# Altium integrated library PlantiumIntegratedLibrary.IntLib: 638 symbols (part 4 of 6)
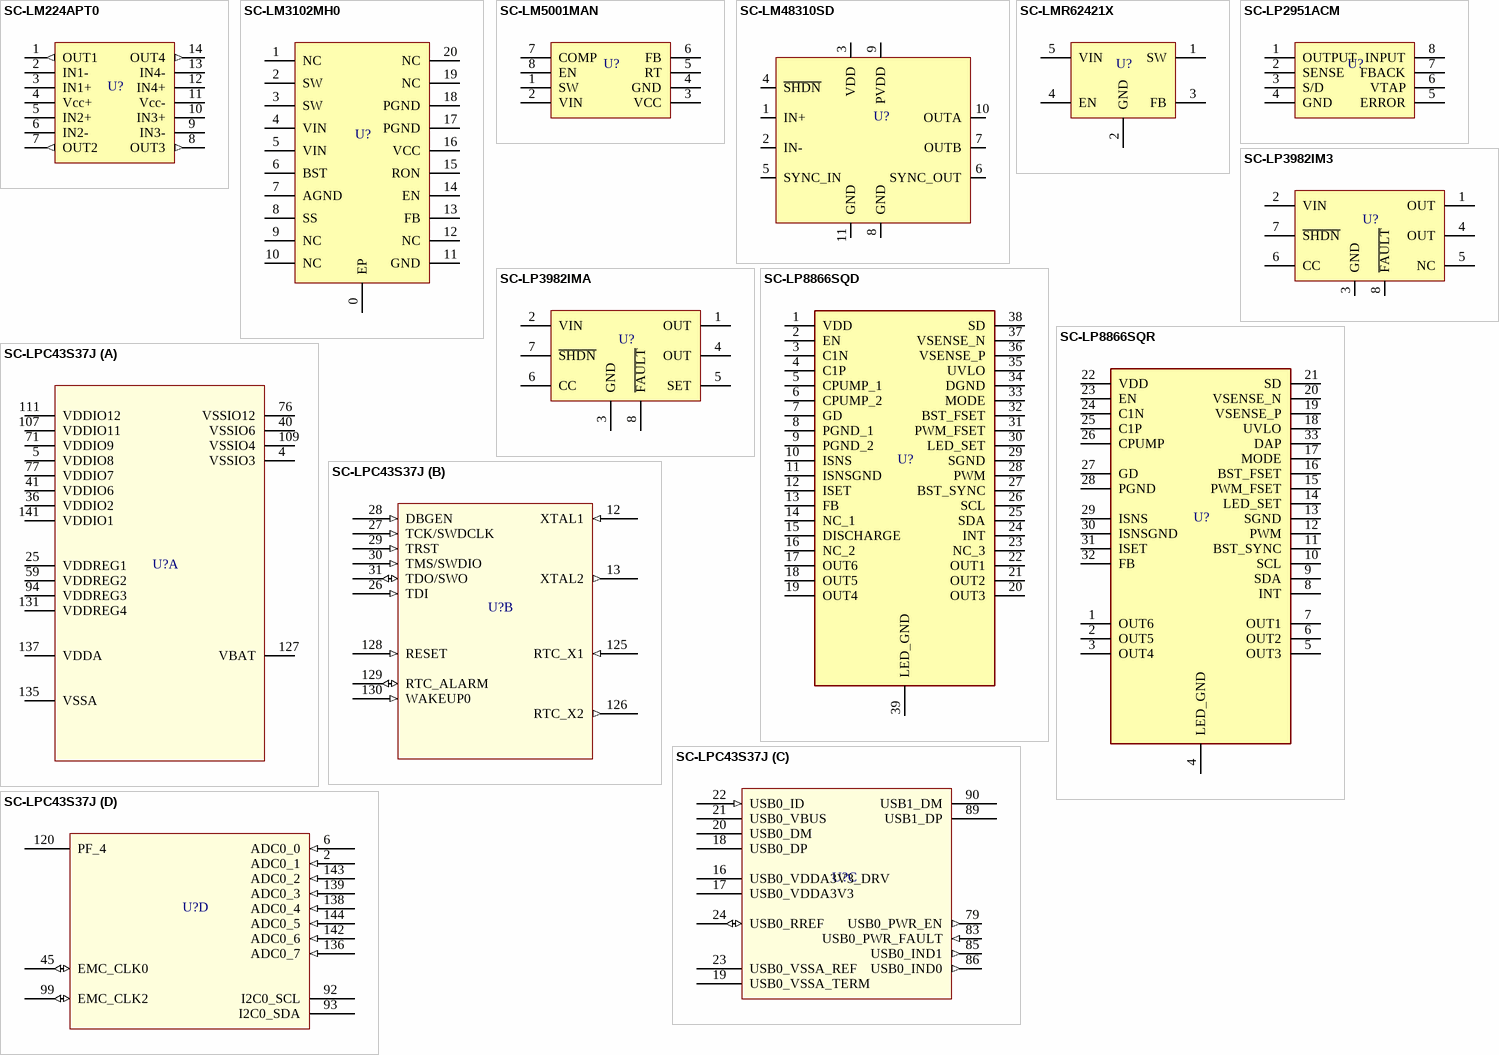
[diagram p37: symbols SC-LM224APT0 to SC-LPC43S37J]

## SC-LM224APT0
designator U?
General Purpose Amplifier 4 Circuit - 14-TSSOP; Manufacturer Part Number: LM224APT; Manufacturer: STMicroelectronics; Working Temperature: -40°C ~ 105°C; Temperature Coefficient: NC; Short Description: IC OPAMP GP 4 CIRCUIT 14TSSOP; Ratings: REACH, ROHS3; Voltage: 3V ~ 30V, ±1.5V ~ 15V; Value: NC; Mounting: SMT; Power: NC; Type: NC; Frequency: NC; Alternate Part Number 1: *; Alternate Part Number 2: *; Tolerance: NC; Current: NC; Revision Date: 03/08/21; Package Reference: TSSOP-14
footprint TSSOP-14 (Footprint not found)
pins: 1 OUT1 (out), 2 IN1- (hiz), 3 IN1+ (hiz), 4 Vcc+ (power), 5 IN2+ (hiz), 6 IN2- (hiz), 7 OUT2 (out), 8 OUT3 (out), 9 IN3- (hiz), 10 IN3+ (hiz), 11 Vcc- (power), 12 IN4+ (hiz), 13 IN4- (hiz), 14 OUT4 (out)

## SC-LM3102MH0
designator U?
Buck Switching Regulator IC Positive Adjustable 0.8V 1 Output 2.5A 20-PowerTSSOP (0.173", 4.40mm Width); Manufacturer Part Number: LM3102MH/NOPB; Manufacturer: Texas Instruments; Working Temperature: -40°C ~ 125°C (TJ); Temperature Coefficient: NC; Short Description: IC REG BUCK ADJ 2.5A 20HTSSOP; Ratings: REACH, ROHS3; Frequency: 1MHz; Voltage: 42V; Value: NC; Mounting: SMT; Power: NC; Type: Buck; Alternate Part Number 1: *; Alternate Part Number 2: *; Tolerance: NC; Current: 2.5A; Revision Date: 03/08/21; Package Reference: HTSSOP-20
footprint HTSSOP-20 (Footprint not found)
pins: 0 EP, 1 NC, 2 SW, 3 SW, 4 VIN, 5 VIN, 6 BST, 7 AGND, 8 SS, 9 NC, 10 NC, 11 GND, 12 NC, 13 FB, 14 EN, 15 RON, 16 VCC, 17 PGND, 18 PGND, 19 NC, 20 NC

## SC-LM5001MAN
designator U?
Boost, Flyback, Forward Converter, SEPIC Switching Regulator IC Positive, Isolation Capable Adjustable 3.1V 1 Output 800mA (Switch) 8-SOIC (0.154", 3.90mm Width); Manufacturer Part Number: LM5001MA/NOPB; Manufacturer: Texas Instruments; Working Temperature: -40°C ~ 125°C (TJ); Temperature Coefficient: NC; Short Description: IC REG MULTI CONFG ADJ 8SOIC; Ratings: REACH, ROHS3; Frequency: 50kHz ~ 1.5MHz; Value: NC; Mounting: SMT; Power: NC; Type: Step-Up; Alternate Part Number 1: *; Alternate Part Number 2: *; Tolerance: NC; Current: 800mA; Revision Date: 03/08/21; Package Reference: SOIC-8N; Voltage: NC
footprint SOIC-8N (Footprint not found)
pins: 1 SW, 2 VIN, 3 VCC, 4 GND, 5 RT, 6 FB, 7 COMP, 8 EN

## SC-LM48310SD
designator U?
Amplifier IC 1-Channel (Mono) Class D 10-WSON (3x3); Manufacturer Part Number: LM48310SD/NOPB; Manufacturer: Texas Instruments; Working Temperature: -40°C ~ 85°C (TA); Temperature Coefficient: NC; Short Description: IC AMP CLASS D MONO 2.6W 10WSON; Power: 2.6W; Ratings: REACH, ROHS3; Voltage: 2.4V ~ 5.5V; Value: NC; Mounting: SMT; Type: Class D; Frequency: NC; Alternate Part Number 1: *; Alternate Part Number 2: *; Tolerance: NC; Current: NC; Revision Date: 03/08/21; Package Reference: WFDFN-10
footprint WFDFN-10
pins: 1 IN+, 2 IN-, 3 VDD, 4 ~{SHDN}, 5 SYNC_IN, 6 SYNC_OUT, 7 OUTB, 8 GND, 9 PVDD, 10 OUTA, 11 GND

## SC-LMR62421X
designator U?
Boost, SEPIC Switching Regulator IC Positive Adjustable 2.7V 1 Output 2.1A (Switch) SC-74A, SOT-753; Manufacturer Part Number: LMR62421XMFE/NOPB; Manufacturer: Texas Instruments; Working Temperature: -40°C ~ 125°C (TJ); Temperature Coefficient: NC; Short Description: IC REG BST SEPIC ADJ 2.1A SOT23; Ratings: REACH, ROHS3; Frequency: 1.6MHz; Value: NC; Mounting: SMT; Power: NC; Type: Step-Up; Alternate Part Number 1: *; Alternate Part Number 2: *; Tolerance: NC; Current: 2.1A; Revision Date: 03/08/21; Package Reference: SOT-23-5; Voltage: NC
footprint SOT-23-5 (Footprint not found)
pins: 1 SW, 2 GND, 3 FB, 4 EN, 5 VIN

## SC-LP2951ACM
designator U?
Linear Voltage Regulator IC Positive Adjustable (Fixed) Output 100mA 8-SOIC; Manufacturer Part Number: LP2951ACM/NOPB; Manufacturer: Texas Instruments; Working Temperature: -40°C ~ 125°C (TJ); Temperature Coefficient: NC; Short Description: IC REG LIN POS ADJ 100MA 8SOIC; Ratings: REACH, ROHS3; Voltage: 30V; Value: NC; Mounting: SMT; Power: NC; Type: Linear; Frequency: NC; Alternate Part Number 1: *; Alternate Part Number 2: *; Tolerance: NC; Current: 100mA; Revision Date: 03/08/21; Package Reference: SOIC-8N
footprint SOIC-8N (Footprint not found)
pins: 1 OUTPUT, 2 SENSE, 3 S/D, 4 GND, 5 ERROR, 6 VTAP, 7 FBACK, 8 INPUT

## SC-LP3982IM3
designator U?
Linear Voltage Regulator IC Positive Fixed 1 Output 300mA 8-VSSOP; Manufacturer Part Number: LP3982IMM-3.3/NOPB; Manufacturer: Texas Instruments; Working Temperature: -40°C ~ 85°C; Temperature Coefficient: NC; Short Description: IC REG LINEAR 3.3V 300MA 8VSSOP; Ratings: REACH, ROHS3; Voltage: 6V; Value: NC; Mounting: SMT; Power: NC; Type: Linear; Frequency: NC; Alternate Part Number 1: *; Alternate Part Number 2: *; Tolerance: NC; Current: 300mA; Revision Date: 03/08/21; Package Reference: VSSOP-8; ComponentLink1Description: Datasheet; ComponentLink1URL: https://www.ti.com/lit/gpn/lp3982
footprint VSSOP-8 (Footprint not found)
pins: 1 OUT, 2 VIN, 3 GND, 4 OUT, 5 NC, 6 CC, 7 ~{SHDN}, 8 ~{FAULT}

## SC-LP3982IMA
designator U?
Linear Voltage Regulator IC Positive Adjustable 1 Output 300mA 8-VSSOP; Manufacturer Part Number: LP3982IMM-ADJ/NOPB; Alternate Part Number 1: LP3982IMMX-ADJ/NOPB; Manufacturer: Texas Instruments; Working Temperature: -40°C ~ 85°C; Temperature Coefficient: NC; Short Description: IC REG LIN POS ADJ 300MA 8VSSOP; Ratings: REACH, ROHS3; Voltage: 6V; Value: NC; Mounting: SMT; Power: NC; Type: Linear; Frequency: NC; Alternate Part Number 2: *; Tolerance: NC; Current: 300mA; Revision Date: 03/08/21; Package Reference: VSSOP-8; ComponentLink1Description: Datasheet; ComponentLink1URL: https://www.ti.com/lit/gpn/lp3982
footprint VSSOP-8 (Footprint not found)
pins: 1 OUT, 2 VIN, 3 GND, 4 OUT, 5 SET, 6 CC, 7 ~{SHDN}, 8 ~{FAULT}

## SC-LP8866SQD
designator U?
LED Driver IC 6 Output DC DC Controller SEPIC, Step-Up (Boost) PWM Dimming 150mA 38-HTSSOP; Manufacturer Part Number: LP8866SQDCPRQ1; Manufacturer: Texas Instruments; Working Temperature: -40°C ~ 125°C; Temperature Coefficient: NC; Short Description: AUTOMOTIVE DISPLAY LED-BACKLIGHT; Ratings: REACH, ROHS3; Value: NC; Mounting: SMT; Power: NC; Type: NC; Frequency: NC; Alternate Part Number 1: *; Alternate Part Number 2: *; Tolerance: NC; Current: NC; Revision Date: 20/09/21; Package Reference: 38-TFSOP; Voltage: NC; ComponentLink1Description: Datasheet; ComponentLink1URL: https://www.ti.com/lit/gpn/lp8866-q1
footprint TFSOP-38
pins: 1 VDD, 2 EN, 3 C1N, 4 C1P, 5 CPUMP_1, 6 CPUMP_2, 7 GD, 8 PGND_1, 9 PGND_2, 10 ISNS, 11 ISNSGND, 12 ISET, 13 FB, 14 NC_1, 15 DISCHARGE, 16 NC_2, 17 OUT6, 18 OUT5, 19 OUT4, 20 OUT3, 21 OUT2, 22 OUT1, 23 NC_3, 24 INT, 25 SDA, 26 SCL, 27 BST_SYNC, 28 PWM, 29 SGND, 30 LED_SET, 31 PWM_FSET, 32 BST_FSET, 33 MODE, 34 DGND, 35 UVLO, 36 VSENSE_P, 37 VSENSE_N, 38 SD, 39 LED_GND

## SC-LP8866SQR
designator U?
LED Driver IC 6 Output DC DC Controller SEPIC, Step-Up (Boost) Analog, I²C, PWM Dimming 150mA 32-VQFN (5x5); Manufacturer Part Number: LP8866SQRHBRQ1; Manufacturer: Texas Instruments; Working Temperature: -40°C ~ 125°C; Temperature Coefficient: NC; Short Description: AUTOMOTIVE DISPLAY LED-BACKLIGHT; Value: NC; Mounting: SMT; Power: NC; Type: NC; Frequency: NC; Alternate Part Number 1: *; Alternate Part Number 2: *; Tolerance: NC; Current: NC; Revision Date: 28/01/2022; Package Reference: VQFN-32_5x5; Voltage: NC; ComponentLink1Description: Datasheet; ComponentLink1URL: https://www.ti.com/lit/gpn/lp8866-q1
footprint VQFN-32_5x5 (32-VFQFN Exposed Pad)
pins: 1 OUT6, 2 OUT5, 3 OUT4, 4 LED_GND, 5 OUT3, 6 OUT2, 7 OUT1, 8 INT, 9 SDA, 10 SCL, 11 BST_SYNC, 12 PWM, 13 SGND, 14 LED_SET, 15 PWM_FSET, 16 BST_FSET, 17 MODE, 18 UVLO, 19 VSENSE_P, 20 VSENSE_N, 21 SD, 22 VDD, 23 EN, 24 C1N, 25 C1P, 26 CPUMP, 27 GD, 28 PGND, 29 ISNS, 30 ISNSGND, 31 ISET, 32 FB, 33 DAP

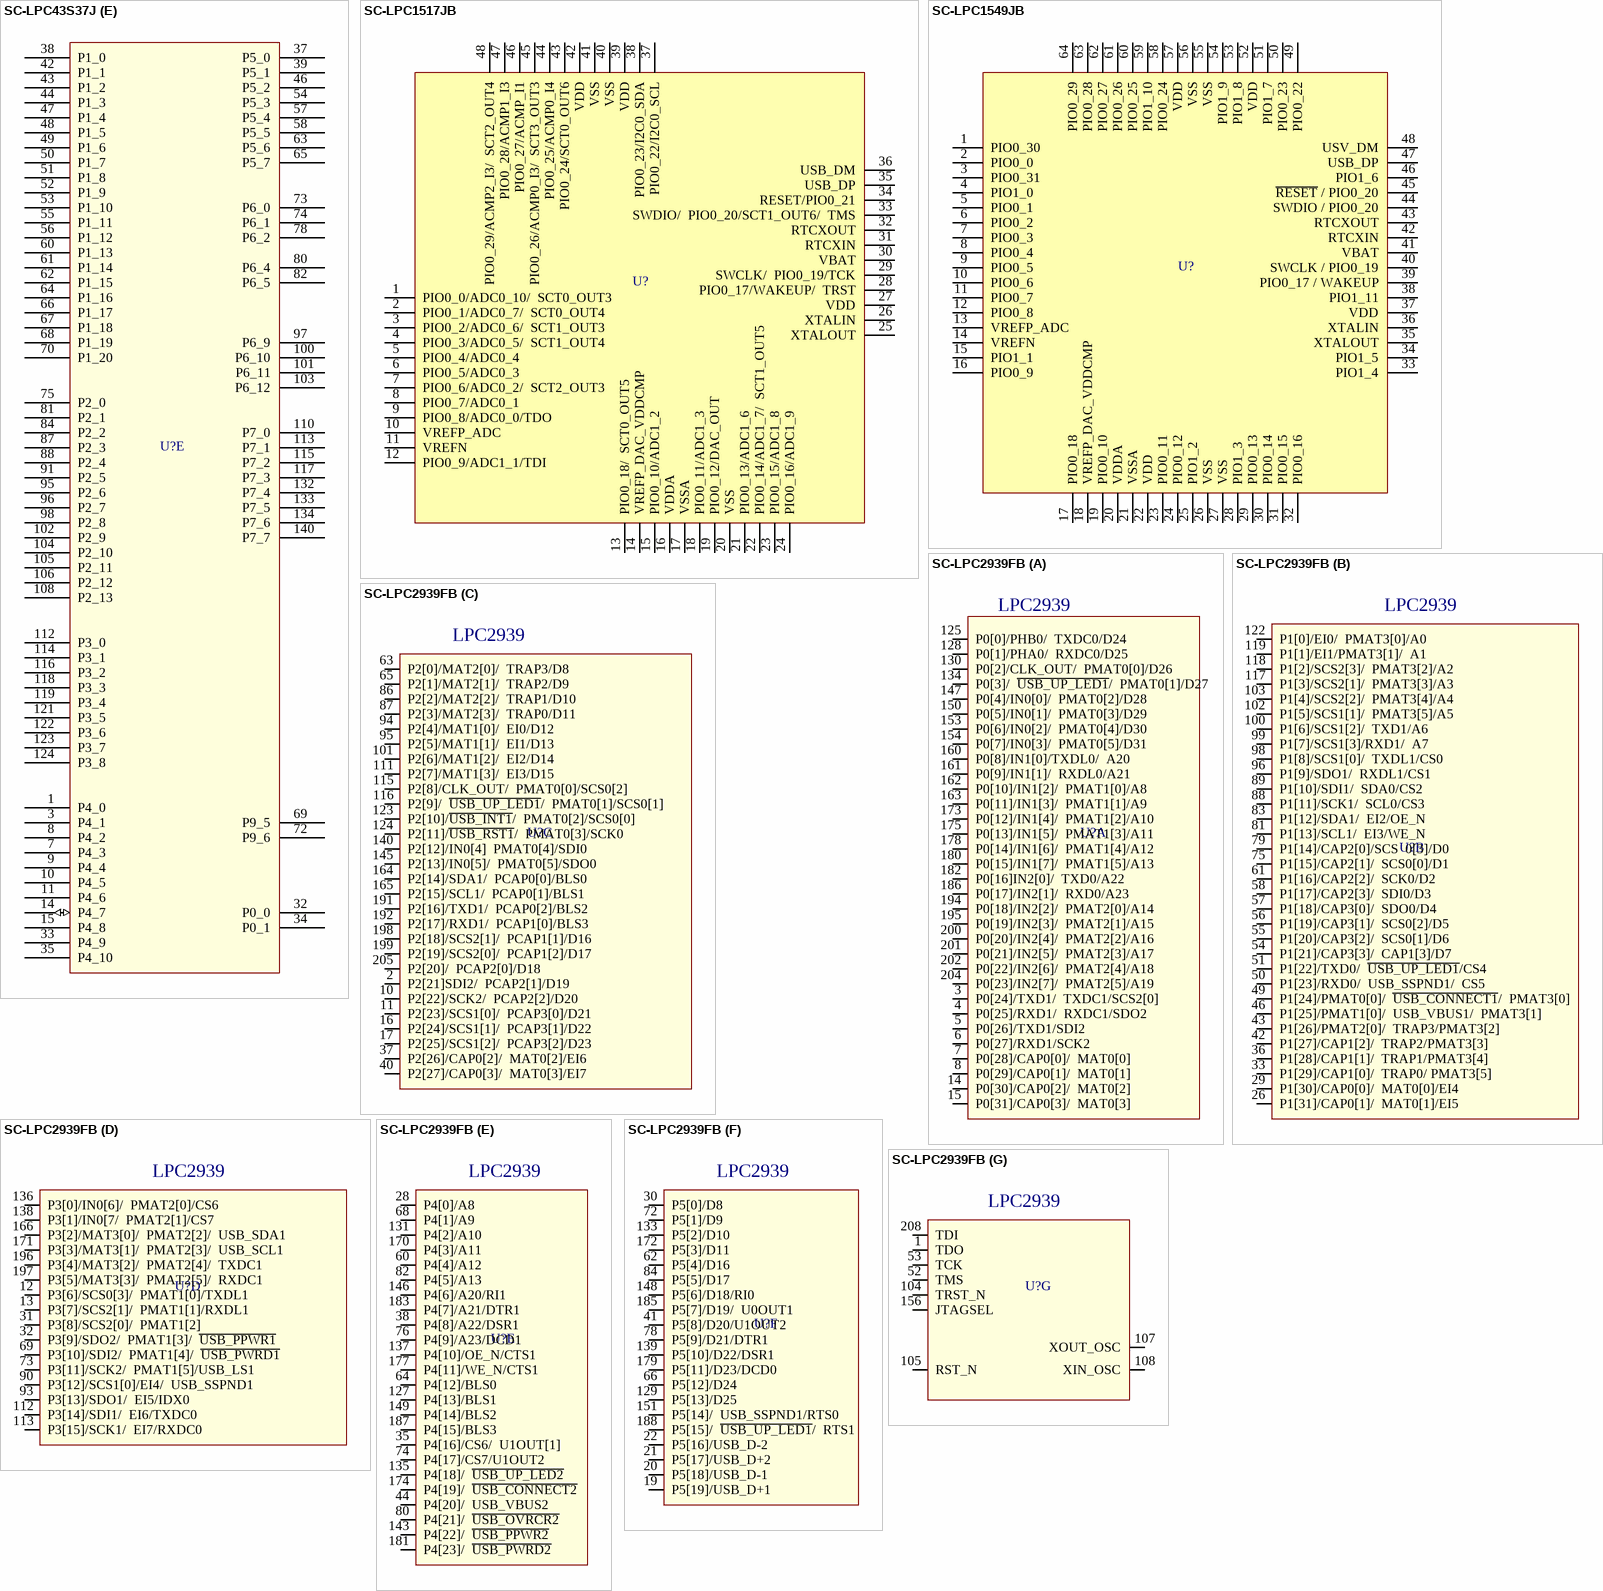
[diagram p18: symbols SC-LPC43S37J to SC-LPC2939FB]

## SC-LPC43S37J
designator U?
ARM® Cortex®-M4/M0 series Microcontroller IC 32-Bit Dual-Core 204MHz 1MB (1M x 8) FLASH 144-LQFP (20x20); Manufacturer Part Number: LPC43S37JBD144E; Manufacturer: NXP USA Inc.; Working Temperature: -40°C ~ 105°C (TA); Temperature Coefficient: NC; Short Description: IC MCU 32BIT 1MB FLASH 144LQFP; Ratings: REACH, ROHS3; Voltage: 2.2V ~ 3.6V; Value: NC; Mounting: SMT; Power: NC; Type: ARM® Cortex®-M4/M0; Frequency: 204MHz; Alternate Part Number 1: *; Alternate Part Number 2: *; Tolerance: NC; Current: NC; Revision Date: 03/08/21; Package Reference: LQFP-144
footprint LQFP-144 (Footprint not found)
part A pins: 4 VSSIO3 (power), 5 VDDIO8 (power), 25 VDDREG1 (power), 36 VDDIO2 (power), 40 VSSIO6 (power), 41 VDDIO6 (power), 59 VDDREG2 (power), 71 VDDIO9 (power), 76 VSSIO12 (power), 77 VDDIO7 (power), 94 VDDREG3 (power), 107 VDDIO11 (power), 109 VSSIO4 (power), 111 VDDIO12 (power), 127 VBAT (power), 131 VDDREG4 (power), 135 VSSA (power), 137 VDDA (power), 141 VDDIO1 (power)
part B pins: 12 XTAL1 (in), 13 XTAL2 (out), 26 TDI (in), 27 TCK/SWDCLK (in), 28 DBGEN (in), 29 TRST (in), 30 TMS/SWDIO (in), 31 TDO/SWO (io), 125 RTC_X1 (in), 126 RTC_X2 (out), 128 RESET (in), 129 RTC_ALARM (io), 130 WAKEUP0 (in)
part C pins: 16 USB0_VDDA3V3_DRV (power), 17 USB0_VDDA3V3 (power), 18 USB0_DP (hiz), 19 USB0_VSSA_TERM (power), 20 USB0_DM (hiz), 21 USB0_VBUS (hiz), 22 USB0_ID (in), 23 USB0_VSSA_REF (power), 24 USB0_RREF (io), 79 USB0_PWR_EN (out), 83 USB0_PWR_FAULT (in), 85 USB0_IND1 (out), 86 USB0_IND0 (out), 89 USB1_DP (hiz), 90 USB1_DM (hiz)
part D pins: 2 ADC0_1 (in), 6 ADC0_0 (in), 45 EMC_CLK0 (io), 92 I2C0_SCL (hiz), 93 I2C0_SDA (hiz), 99 EMC_CLK2 (io), 120 PF_4 (hiz), 136 ADC0_7 (in), 138 ADC0_4 (in), 139 ADC0_3 (in), 142 ADC0_6 (in), 143 ADC0_2 (in), 144 ADC0_5 (in)
part E pins: 1 P4_0 (hiz), 3 P4_1 (hiz), 7 P4_3 (hiz), 8 P4_2 (hiz), 9 P4_4 (hiz), 10 P4_5 (hiz), 11 P4_6 (hiz), 14 P4_7 (io), 15 P4_8 (hiz), 32 P0_0 (hiz), 33 P4_9 (hiz), 34 P0_1 (hiz), 35 P4_10 (hiz), 37 P5_0 (hiz), 38 P1_0 (hiz), 39 P5_1 (hiz), 42 P1_1 (hiz), 43 P1_2 (hiz), 44 P1_3 (hiz), 46 P5_2 (hiz), 47 P1_4 (hiz), 48 P1_5 (hiz), 49 P1_6 (hiz), 50 P1_7 (hiz), 51 P1_8 (hiz), 52 P1_9 (hiz), 53 P1_10 (hiz), 54 P5_3 (hiz), 55 P1_11 (hiz), 56 P1_12 (hiz), 57 P5_4 (hiz), 58 P5_5 (hiz), 60 P1_13 (hiz), 61 P1_14 (hiz), 62 P1_15 (hiz), 63 P5_6 (hiz), 64 P1_16 (hiz), 65 P5_7 (hiz), 66 P1_17 (hiz), 67 P1_18 (hiz), 68 P1_19 (hiz), 69 P9_5 (hiz), 70 P1_20 (hiz), 72 P9_6 (hiz), 73 P6_0 (hiz), 74 P6_1 (hiz), 75 P2_0 (hiz), 78 P6_2 (hiz), 80 P6_4 (hiz), 81 P2_1 (hiz), 82 P6_5 (hiz), 84 P2_2 (hiz), 87 P2_3 (hiz), 88 P2_4 (hiz), 91 P2_5 (hiz), 95 P2_6 (hiz), 96 P2_7 (hiz), 97 P6_9 (hiz), 98 P2_8 (hiz), 100 P6_10 (hiz), 101 P6_11 (hiz), 102 P2_9 (hiz), 103 P6_12 (hiz), 104 P2_10 (hiz), 105 P2_11 (hiz), 106 P2_12 (hiz), 108 P2_13 (hiz), 110 P7_0 (hiz), 112 P3_0 (hiz), 113 P7_1 (hiz), 114 P3_1 (hiz), 115 P7_2 (hiz), 116 P3_2 (hiz), 117 P7_3 (hiz), 118 P3_3 (hiz), 119 P3_4 (hiz), 121 P3_5 (hiz), 122 P3_6 (hiz), 123 P3_7 (hiz), 124 P3_8 (hiz), 132 P7_4 (hiz), 133 P7_5 (hiz), 134 P7_6 (hiz), 140 P7_7 (hiz)

## SC-LPC1517JB
designator U?
ARM® Cortex®-M3 series Microcontroller IC 32-Bit 72MHz 64KB (64K x 8) FLASH 48-LQFP (7x7); Manufacturer Part Number: LPC1517JBD48E; Manufacturer: NXP USA Inc.; Working Temperature: -40°C ~ 105°C (TA); Temperature Coefficient: NC; Short Description: IC MCU 32BIT 64KB FLASH 48LQFP; Ratings: REACH, ROHS3; Voltage: 2.4V ~ 3.6V; Value: NC; Mounting: SMT; Power: NC; Type: ARM® Cortex®-M3; Frequency: 72MHz; Alternate Part Number 1: *; Alternate Part Number 2: *; Tolerance: NC; Current: NC; Revision Date: 03/08/21; Package Reference: LQFP-48
footprint LQFP-48 (Footprint not found)
pins: 1 PIO0_0/ADC0_10/  SCT0_OUT3, 2 PIO0_1/ADC0_7/  SCT0_OUT4, 3 PIO0_2/ADC0_6/  SCT1_OUT3, 4 PIO0_3/ADC0_5/  SCT1_OUT4, 5 PIO0_4/ADC0_4, 6 PIO0_5/ADC0_3, 7 PIO0_6/ADC0_2/  SCT2_OUT3, 8 PIO0_7/ADC0_1, 9 PIO0_8/ADC0_0/TDO, 10 VREFP_ADC, 11 VREFN, 12 PIO0_9/ADC1_1/TDI, 13 PIO0_18/  SCT0_OUT5, 14 VREFP_DAC_VDDCMP, 15 PIO0_10/ADC1_2, 16 VDDA, 17 VSSA, 18 PIO0_11/ADC1_3, 19 PIO0_12/DAC_OUT, 20 VSS, 21 PIO0_13/ADC1_6, 22 PIO0_14/ADC1_7/  SCT1_OUT5, 23 PIO0_15/ADC1_8, 24 PIO0_16/ADC1_9, 25 XTALOUT, 26 XTALIN, 27 VDD, 28 PIO0_17/WAKEUP/  TRST, 29 SWCLK/  PIO0_19/TCK, 30 VBAT, 31 RTCXIN, 32 RTCXOUT, 33 SWDIO/  PIO0_20/SCT1_OUT6/  TMS, 34 RESET/PIO0_21, 35 USB_DP, 36 USB_DM, 37 PIO0_22/I2C0_SCL, 38 PIO0_23/I2C0_SDA, 39 VDD, 40 VSS, 41 VSS, 42 VDD, 43 PIO0_24/SCT0_OUT6, 44 PIO0_25/ACMP0_I4, 45 PIO0_26/ACMP0_I3/  SCT3_OUT3, 46 PIO0_27/ACMP_I1, 47 PIO0_28/ACMP1_I3, 48 PIO0_29/ACMP2_I3/  SCT2_OUT4

## SC-LPC1549JB
designator U?
ARM® Cortex®-M3 series Microcontroller IC 32-Bit 72MHz 256KB (256K x 8) FLASH 64-LQFP (10x10); Manufacturer Part Number: LPC1549JBD64QL; Manufacturer: NXP USA Inc.; Working Temperature: -40°C ~ 105°C (TA); Temperature Coefficient: NC; Short Description: IC MCU 32BIT 256KB FLASH 64LQFP; Ratings: REACH, ROHS3; Voltage: 2.4V ~ 3.6V; Value: NC; Mounting: SMT; Power: NC; Type: ARM® Cortex®-M3; Frequency: 72MHz; Alternate Part Number 1: *; Alternate Part Number 2: *; Tolerance: NC; Current: NC; Revision Date: 03/08/21; Package Reference: LQFP-64
footprint LQFP-64 (Footprint not found)
pins: 1 PIO0_30, 2 PIO0_0, 3 PIO0_31, 4 PIO1_0, 5 PIO0_1, 6 PIO0_2, 7 PIO0_3, 8 PIO0_4, 9 PIO0_5, 10 PIO0_6, 11 PIO0_7, 12 PIO0_8, 13 VREFP_ADC, 14 VREFN, 15 PIO1_1, 16 PIO0_9, 17 PIO0_18, 18 VREFP_DAC_VDDCMP, 19 PIO0_10, 20 VDDA, 21 VSSA, 22 VDD, 23 PIO0_11, 24 PIO0_12, 25 PIO1_2, 26 VSS, 27 VSS, 28 PIO1_3, 29 PIO0_13, 30 PIO0_14, 31 PIO0_15, 32 PIO0_16, 33 PIO1_4, 34 PIO1_5, 35 XTALOUT, 36 XTALIN, 37 VDD, 38 PIO1_11, 39 PIO0_17 / WAKEUP, 40 SWCLK / PIO0_19, 41 VBAT, 42 RTCXIN, 43 RTCXOUT, 44 SWDIO / PIO0_20, 45 ~{RESET} / PIO0_20, 46 PIO1_6, 47 USB_DP, 48 USV_DM, 49 PIO0_22, 50 PIO0_23, 51 PIO1_7, 52 VDD, 53 PIO1_8, 54 PIO1_9, 55 VSS, 56 VSS, 57 VDD, 58 PIO0_24, 59 PIO1_10, 60 PIO0_25, 61 PIO0_26, 62 PIO0_27, 63 PIO0_28, 64 PIO0_29

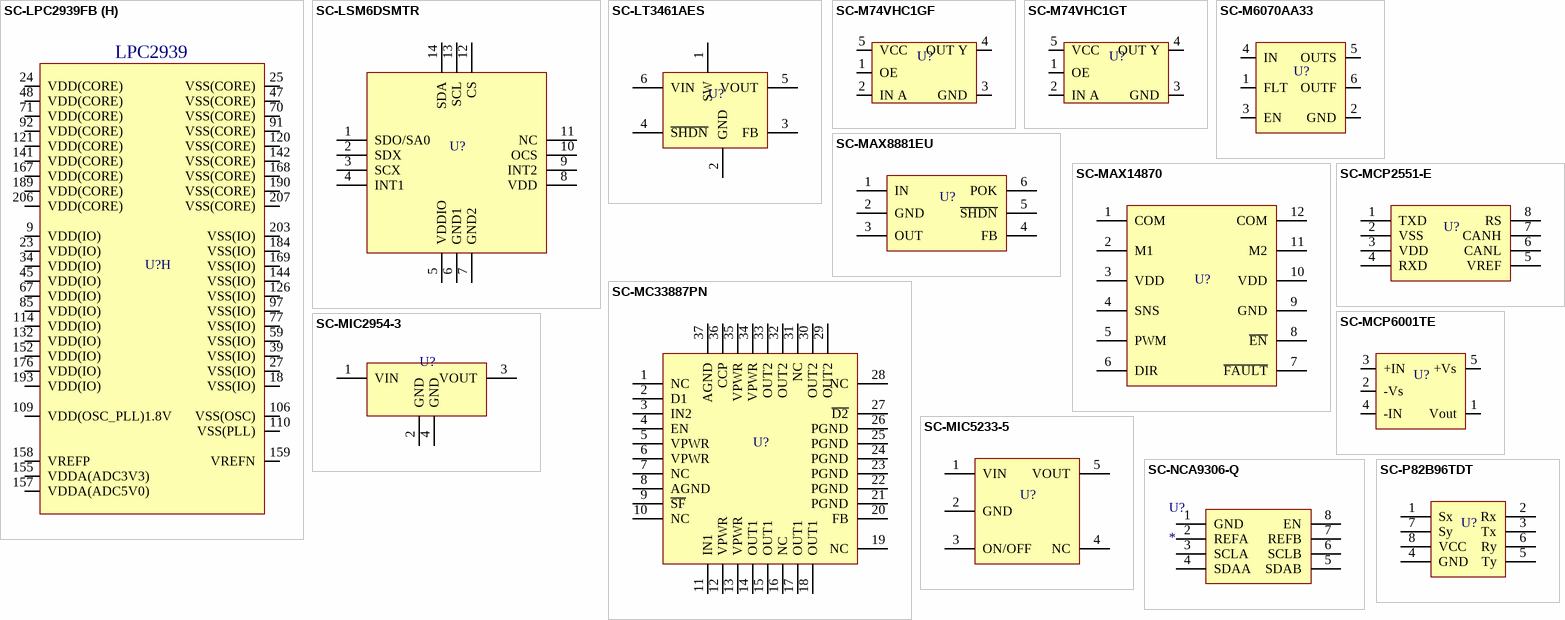
[diagram p19: symbols SC-LPC2939FB to SC-P82B96TDT]

## SC-LPC2939FB
designator U?
ARM9® series Microcontroller IC 16/32-Bit 125MHz 768KB (768K x 8) FLASH 208-LQFP (28x28); Manufacturer Part Number: LPC2939FBD208,551; Manufacturer: NXP USA Inc.; Working Temperature: -40°C ~ 85°C (TA); Temperature Coefficient: NC; Short Description: IC MCU 16/32B 768KB FLSH 208LQFP; Ratings: REACH, ROHS3; Voltage: 1.71V ~ 3.6V; Value: NC; Mounting: SMT; Power: NC; Type: ARM9®; Frequency: 125MHz; Alternate Part Number 1: *; Alternate Part Number 2: *; Tolerance: NC; Current: NC; Revision Date: 03/08/21; Package Reference: LQFP-208
footprint LQFP-208 (Footprint not found)
part A pins: 3 P0[24]/TXD1/  TXDC1/SCS2[0], 4 P0[25]/RXD1/  RXDC1/SDO2, 5 P0[26]/TXD1/SDI2, 6 P0[27]/RXD1/SCK2, 7 P0[28]/CAP0[0]/  MAT0[0], 8 P0[29]/CAP0[1]/  MAT0[1], 14 P0[30]/CAP0[2]/  MAT0[2], 15 P0[31]/CAP0[3]/  MAT0[3], 125 P0[0]/PHB0/  TXDC0/D24, 128 P0[1]/PHA0/  RXDC0/D25, 130 P0[2]/CLK_OUT/  PMAT0[0]/D26, 134 P0[3]/  ~{USB_UP_LED1}/  PMAT0[1]/D27, 147 P0[4]/IN0[0]/  PMAT0[2]/D28, 150 P0[5]/IN0[1]/  PMAT0[3]/D29, 153 P0[6]/IN0[2]/  PMAT0[4]/D30, 154 P0[7]/IN0[3]/  PMAT0[5]/D31, 160 P0[8]/IN1[0]/TXDL0/  A20, 161 P0[9]/IN1[1]/  RXDL0/A21, 162 P0[10]/IN1[2]/  PMAT1[0]/A8, 163 P0[11]/IN1[3]/  PMAT1[1]/A9, 173 P0[12]/IN1[4]/  PMAT1[2]/A10, 175 P0[13]/IN1[5]/  PMAT1[3]/A11, 178 P0[14]/IN1[6]/  PMAT1[4]/A12, 180 P0[15]/IN1[7]/  PMAT1[5]/A13, 182 P0[16]IN2[0]/  TXD0/A22, 186 P0[17]/IN2[1]/  RXD0/A23, 194 P0[18]/IN2[2]/  PMAT2[0]/A14, 195 P0[19]/IN2[3]/  PMAT2[1]/A15, 200 P0[20]/IN2[4]/  PMAT2[2]/A16, 201 P0[21]/IN2[5]/  PMAT2[3]/A17, 202 P0[22]/IN2[6]/  PMAT2[4]/A18, 204 P0[23]/IN2[7]/  PMAT2[5]/A19
part B pins: 26 P1[31]/CAP0[1]/  MAT0[1]/EI5, 29 P1[30]/CAP0[0]/  MAT0[0]/EI4, 33 P1[29]/CAP1[0]/  TRAP0/ PMAT3[5], 36 P1[28]/CAP1[1]/  TRAP1/PMAT3[4], 42 P1[27]/CAP1[2]/  TRAP2/PMAT3[3], 43 P1[26]/PMAT2[0]/  TRAP3/PMAT3[2], 46 P1[25]/PMAT1[0]/  USB_VBUS1/  PMAT3[1], 49 P1[24]/PMAT0[0]/  ~{USB_CONNECT1}/  PMAT3[0], 50 P1[23]/RXD0/  USB_SSPND1/  CS5, 51 P1[22]/TXD0/  ~{USB_UP_LED1}/CS4, 54 P1[21]/CAP3[3]/  CAP1[3]/D7, 55 P1[20]/CAP3[2]/  SCS0[1]/D6, 56 P1[19]/CAP3[1]/  SCS0[2]/D5, 57 P1[18]/CAP3[0]/  SDO0/D4, 58 P1[17]/CAP2[3]/  SDI0/D3, 61 P1[16]/CAP2[2]/  SCK0/D2, 75 P1[15]/CAP2[1]/  SCS0[0]/D1, 79 P1[14]/CAP2[0]/SCS  0[3]/D0, 81 P1[13]/SCL1/  EI3/WE_N, 83 P1[12]/SDA1/  EI2/OE_N, 88 P1[11]/SCK1/  SCL0/CS3, 89 P1[10]/SDI1/  SDA0/CS2, 96 P1[9]/SDO1/  RXDL1/CS1, 98 P1[8]/SCS1[0]/  TXDL1/CS0, 99 P1[7]/SCS1[3]/RXD1/  A7, 100 P1[6]/SCS1[2]/  TXD1/A6, 102 P1[5]/SCS1[1]/  PMAT3[5]/A5, 103 P1[4]/SCS2[2]/  PMAT3[4]/A4, 117 P1[3]/SCS2[1]/  PMAT3[3]/A3, 118 P1[2]/SCS2[3]/  PMAT3[2]/A2, 119 P1[1]/EI1/PMAT3[1]/  A1, 122 P1[0]/EI0/  PMAT3[0]/A0
part C pins: 2 P2[21]SDI2/  PCAP2[1]/D19, 10 P2[22]/SCK2/  PCAP2[2]/D20, 11 P2[23]/SCS1[0]/  PCAP3[0]/D21, 16 P2[24]/SCS1[1]/  PCAP3[1]/D22, 17 P2[25]/SCS1[2]/  PCAP3[2]/D23, 37 P2[26]/CAP0[2]/  MAT0[2]/EI6, 40 P2[27]/CAP0[3]/  MAT0[3]/EI7, 63 P2[0]/MAT2[0]/  TRAP3/D8, 65 P2[1]/MAT2[1]/  TRAP2/D9, 86 P2[2]/MAT2[2]/  TRAP1/D10, 87 P2[3]/MAT2[3]/  TRAP0/D11, 94 P2[4]/MAT1[0]/  EI0/D12, 95 P2[5]/MAT1[1]/  EI1/D13, 101 P2[6]/MAT1[2]/  EI2/D14, 111 P2[7]/MAT1[3]/  EI3/D15, 115 P2[8]/CLK_OUT/  PMAT0[0]/SCS0[2], 116 P2[9]/  ~{USB_UP_LED1}/  PMAT0[1]/SCS0[1], 123 P2[10]/~{USB_INT1}/  PMAT0[2]/SCS0[0], 124 P2[11]/~{USB_RST1}/  PMAT0[3]/SCK0, 140 P2[12]/IN0[4]  PMAT0[4]/SDI0, 145 P2[13]/IN0[5]/  PMAT0[5]/SDO0, 164 P2[14]/SDA1/  PCAP0[0]/BLS0, 165 P2[15]/SCL1/  PCAP0[1]/BLS1, 191 P2[16]/TXD1/  PCAP0[2]/BLS2, 192 P2[17]/RXD1/  PCAP1[0]/BLS3, 198 P2[18]/SCS2[1]/  PCAP1[1]/D16, 199 P2[19]/SCS2[0]/  PCAP1[2]/D17, 205 P2[20]/  PCAP2[0]/D18
part D pins: 12 P3[6]/SCS0[3]/  PMAT1[0]/TXDL1, 13 P3[7]/SCS2[1]/  PMAT1[1]/RXDL1, 31 P3[8]/SCS2[0]/  PMAT1[2], 32 P3[9]/SDO2/  PMAT1[3]/  ~{USB_PPWR1}, 69 P3[10]/SDI2/  PMAT1[4]/  ~{USB_PWRD1}, 73 P3[11]/SCK2/  PMAT1[5]/USB_LS1, 90 P3[12]/SCS1[0]/EI4/  USB_SSPND1, 93 P3[13]/SDO1/  EI5/IDX0, 112 P3[14]/SDI1/  EI6/TXDC0, 113 P3[15]/SCK1/  EI7/RXDC0, 136 P3[0]/IN0[6]/  PMAT2[0]/CS6, 138 P3[1]/IN0[7/  PMAT2[1]/CS7, 166 P3[2]/MAT3[0]/  PMAT2[2]/  USB_SDA1, 171 P3[3]/MAT3[1]/  PMAT2[3]/  USB_SCL1, 196 P3[4]/MAT3[2]/  PMAT2[4]/  TXDC1, 197 P3[5]/MAT3[3]/  PMAT2[5]/  RXDC1
part E pins: 28 P4[0]/A8, 35 P4[16]/CS6/  U1OUT[1], 38 P4[8]/A22/DSR1, 44 P4[20]/  USB_VBUS2, 60 P4[4]/A12, 64 P4[12]/BLS0, 68 P4[1]/A9, 74 P4[17]/CS7/U1OUT2, 76 P4[9]/A23/DCD1, 80 P4[21]/  ~{USB_OVRCR2}, 82 P4[5]/A13, 127 P4[13]/BLS1, 131 P4[2]/A10, 135 P4[18]/  ~{USB_UP_LED2}, 137 P4[10]/OE_N/CTS1, 143 P4[22]/  ~{USB_PPWR2}, 146 P4[6]/A20/RI1, 149 P4[14]/BLS2, 170 P4[3]/A11, 174 P4[19]/  ~{USB_CONNECT2}, 177 P4[11]/WE_N/CTS1, 181 P4[23]/  ~{USB_PWRD2}, 183 P4[7]/A21/DTR1, 187 P4[15]/BLS3
part F pins: 19 P5[19]/USB_D+1, 20 P5[18]/USB_D-1, 21 P5[17]/USB_D+2, 22 P5[16]/USB_D-2, 30 P5[0]/D8, 41 P5[8]/D20/U1OUT2, 62 P5[4]/D16, 66 P5[12]/D24, 72 P5[1]/D9, 78 P5[9]/D21/DTR1, 84 P5[5]/D17, 129 P5[13]/D25, 133 P5[2]/D10, 139 P5[10]/D22/DSR1, 148 P5[6]/D18/RI0, 151 P5[14]/  USB_SSPND1/RTS0, 172 P5[3]/D11, 179 P5[11]/D23/DCD0, 185 P5[7]/D19/  U0OUT1, 188 P5[15]/  ~{USB_UP_LED1}/  RTS1
part G pins: 1 TDO, 52 TMS, 53 TCK, 104 TRST_N, 105 RST_N, 107 XOUT_OSC, 108 XIN_OSC, 156 JTAGSEL, 208 TDI
part H pins: 9 VDD(IO), 18 VSS(IO), 23 VDD(IO), 24 VDD(CORE), 25 VSS(CORE), 27 VSS(IO), 34 VDD(IO), 39 VSS(IO), 45 VDD(IO), 47 VSS(CORE), 48 VDD(CORE), 59 VSS(IO), 67 VDD(IO), 70 VSS(CORE), 71 VDD(CORE), 77 VSS(IO), 85 VDD(IO), 91 VSS(CORE), 92 VDD(CORE), 97 VSS(IO), 106 VSS(OSC), 109 VDD(OSC_PLL)1.8V, 110 VSS(PLL), 114 VDD(IO), 120 VSS(CORE), 121 VDD(CORE), 126 VSS(IO), 132 VDD(IO), 141 VDD(CORE), 142 VSS(CORE), 144 VSS(IO), 152 VDD(IO), 155 VDDA(ADC3V3), 157 VDDA(ADC5V0), 158 VREFP, 159 VREFN, 167 VDD(CORE), 168 VSS(CORE), 169 VSS(IO), 176 VDD(IO), 184 VSS(IO), 189 VDD(CORE), 190 VSS(CORE), 193 VDD(IO), 203 VSS(IO), 206 VDD(CORE), 207 VSS(CORE)
part A text: LPC2939
part B text: LPC2939
part C text: LPC2939
part D text: LPC2939
part E text: LPC2939
part F text: LPC2939
part G text: LPC2939
part H text: LPC2939

## SC-LSM6DSMTR
designator U?
Accelerometer, Gyroscope, Temperature, 6 Axis Sensor I²C, SPI Output; Manufacturer Part Number: LSM6DSMTR; Manufacturer: STMicroelectronics; Working Temperature: -40°C ~ 85°C (TA); Temperature Coefficient: NC; Short Description: IMU ACCEL/GYRO I2C/SPI 14LGA; Ratings: REACH, ROHS3; Value: NC; Mounting: SMT; Power: NC; Type: IMU; Frequency: NC; Alternate Part Number 1: *; Alternate Part Number 2: *; Tolerance: NC; Current: NC; Revision Date: 03/08/21; Package Reference: VFLGA-14; Voltage: NC
footprint VFLGA-14 (Footprint not found)
pins: 1 SDO/SA0, 2 SDX, 3 SCX, 4 INT1, 5 VDDIO, 6 GND1, 7 GND2, 8 VDD, 9 INT2, 10 OCS, 11 NC, 12 CS, 13 SCL, 14 SDA

## SC-LT3461AES
designator U?
Boost Switching Regulator IC Positive Adjustable 1.255V 1 Output 300mA (Switch) SOT-23-6 Thin, TSOT-23-6; Manufacturer Part Number: LT3461AES6#TRMPBF; Manufacturer: Analog Devices Inc.; Working Temperature: 0°C ~ 70°C (TA); Temperature Coefficient: NC; Short Description: IC REG BOOST ADJ 300MA TSOT23-6; Ratings: REACH, ROHS3; Frequency: 3MHz; Value: NC; Mounting: SMT; Power: NC; Type: Step-Up; Alternate Part Number 1: *; Alternate Part Number 2: *; Tolerance: NC; Current: 300mA; Revision Date: 03/08/21; Package Reference: SOT-23-6; Voltage: NC
footprint SOT-23-6 (Footprint not found)
pins: 1 SW, 2 GND, 3 FB, 4 ~{SHDN}, 5 VOUT, 6 VIN

## SC-M74VHC1GF
designator U?
Buffer, Non-Inverting 1 Element 1 Bit per Element 3-State Output SC-88A (SC-70-5/SOT-353); Manufacturer Part Number: M74VHC1GT126DF1G; Manufacturer: ON Semiconductor; Working Temperature: -55°C ~ 125°C (TA); Temperature Coefficient: NC; Short Description: IC BUFFER NON-INVERT 5.5V SC88A; Ratings: REACH, ROHS3; Voltage: 3V ~ 5.5V; Value: NC; Mounting: SMT; Power: NC; Type: Buffer; Frequency: NC; Alternate Part Number 1: *; Alternate Part Number 2: *; Tolerance: NC; Current: NC; Revision Date: 03/08/21; Package Reference: SC-70-5
footprint SC-70-5
pins: 1 OE, 2 IN A, 3 GND, 4 OUT Y, 5 VCC

## SC-M74VHC1GT
designator U?
Buffer, Non-Inverting 1 Element 1 Bit per Element 3-State Output 5-TSOP; Manufacturer Part Number: M74VHC1GT126DT1G; Manufacturer: ON Semiconductor; Working Temperature: -55°C ~ 125°C (TA); Temperature Coefficient: NC; Short Description: IC BUFFER NON-INVERT 5.5V 5TSOP; Ratings: REACH, ROHS3; Voltage: 3V ~ 5.5V; Value: NC; Mounting: SMT; Power: NC; Type: Buffer; Frequency: NC; Alternate Part Number 1: *; Alternate Part Number 2: *; Tolerance: NC; Current: NC; Revision Date: 03/08/21; Package Reference: SOT-23-5
footprint SOT-23-5 (Footprint not found)
pins: 1 OE, 2 IN A, 3 GND, 4 OUT Y, 5 VCC

## SC-M6070AA33
designator U?
Series Voltage Reference IC Fixed 3.3V V ±0.04% 10 mA SOT-6; Manufacturer Part Number: MAX6070AAUT33+T; Manufacturer: Maxim Integrated; Working Temperature: -40°C ~ 125°C (TA); Temperature Coefficient: 6ppm/°C; Short Description: IC VREF SERIES 0.04% SOT6; Power: NC; Ratings: REACH, ROHS3; Current: 10mA; Value: NC; Mounting: SMT; Type: NC; Frequency: NC; Alternate Part Number 1: *; Alternate Part Number 2: *; Tolerance: ±0.04%; Revision Date: 16/09/21; Package Reference: SOT-23-6; Voltage: 3.3V
footprint SOT-23-6
pins: 1 FLT, 2 GND, 3 EN, 4 IN, 5 OUTS, 6 OUTF

## SC-MAX8881EU
designator U?
Linear Voltage Regulator IC Positive Fixed 1 Output 200mA SOT-6; Manufacturer Part Number: MAX8881EUT33+T; Manufacturer: Maxim Integrated; Working Temperature: -40°C ~ 85°C (TA); Temperature Coefficient: NC; Short Description: IC REG LINEAR 3.3V 200MA SOT23-6; Ratings: REACH, ROHS3; Voltage: 2.5V ~ 12V; Value: NC; Mounting: SMT; Power: NC; Type: Buck; Frequency: NC; Alternate Part Number 1: *; Alternate Part Number 2: *; Tolerance: NC; Current: 200mA; Revision Date: 15/10/21; Package Reference: SOT-23-6
footprint SOT-23-6 (Footprint not found)
pins: 1 IN, 2 GND, 3 OUT, 4 FB, 5 ~{SHDN}, 6 POK

## SC-MAX14870
designator U?
Motor Driver Bi-CMOS PWM 12-TDFN (3x3); Manufacturer Part Number: MAX14870ETC+T; Manufacturer: Maxim Integrated; Working Temperature: -40°C ~ 150°C (TJ); Temperature Coefficient: NC; Short Description: IC MOTOR DRIVER 4.5V-36V 12TDFN; Ratings: REACH, ROHS3; Current: 3A; Voltage: 4.5V ~ 36V; Value: NC; Mounting: SMT; Power: NC; Type: NC; Frequency: NC; Alternate Part Number 1: *; Alternate Part Number 2: *; Tolerance: NC; Revision Date: 14/10/21; Package Reference: *
footprint TDFN12-3X3 (Footprint not found)
pins: 1 COM, 2 M1, 3 VDD, 4 SNS, 5 PWM, 6 DIR, 7 ~{FAULT}, 8 ~{EN}, 9 GND, 10 VDD, 11 M2, 12 COM

## SC-MC33887PN
designator U?
Motor Driver Power MOSFET Parallel 36-PWR QFN (9x9); Manufacturer Part Number: MC33887PNB; Manufacturer: NXP USA Inc.; Working Temperature: -40°C ~ 150°C (TJ); Temperature Coefficient: NC; Short Description: IC MOTOR DRIVER 5V-28V 36PQFN; Ratings: REACH, ROHS3; Current: 5A; Voltage: 5V ~ 28V; Value: NC; Mounting: SMT; Power: NC; Type: Half Bridge (x2); Frequency: NC; Alternate Part Number 1: *; Alternate Part Number 2: *; Tolerance: NC; Revision Date: 03/08/21; Package Reference: PQFN-36_9X9
footprint PQFN-36_9x9 (Footprint not found)
pins: 1 NC, 2 D1, 3 IN2, 4 EN, 5 VPWR, 6 VPWR, 7 NC, 8 AGND, 9 ~{SF}, 10 NC, 11 IN1, 12 VPWR, 13 VPWR, 14 OUT1, 15 OUT1, 16 NC, 17 OUT1, 18 OUT1, 19 NC, 20 FB, 21 PGND, 22 PGND, 23 PGND, 24 PGND, 25 PGND, 26 PGND, 27 ~{D2}, 28 NC, 29 OUT2, 30 OUT2, 31 NC, 32 OUT2, 33 OUT2, 34 VPWR, 35 VPWR, 36 CCP, 37 AGND

## SC-MCP2551-E
designator U?
1/1 Transceiver Half CANbus 8-SOIC; Manufacturer Part Number: MCP2561-E/SN; Manufacturer: Microchip Technology; Working Temperature: -40°C ~ 125°C; Temperature Coefficient: NC; Short Description: IC TRANSCEIVER HALF 1/1 8SOIC; Ratings: REACH, ROHS3; Voltage: 4.5V ~ 5.5V; Value: NC; Mounting: SMT; Power: NC; Type: Half-Duplex; Frequency: NC; Alternate Part Number 1: *; Alternate Part Number 2: *; Tolerance: NC; Current: NC; Revision Date: 03/08/21; Package Reference: SOIC-8N
footprint SOIC-8N (Footprint not found)
pins: 1 TXD, 2 VSS, 3 VDD, 4 RXD, 5 VREF, 6 CANL, 7 CANH, 8 RS

## SC-MCP6001TE
designator U?
General Purpose Amplifier 1 Circuit Rail-to-Rail SC-70-5; Manufacturer Part Number: MCP6001T-E/LT; Manufacturer: Microchip Technology; Working Temperature: -40°C ~ 125°C; Temperature Coefficient: NC; Short Description: IC OPAMP GP 1 CIRCUIT SC70-5; Ratings: REACH, ROHS3; Current: 23 mA; Voltage: 1.8V ~ 6V; Value: NC; Mounting: SMT; Power: NC; Type: Rail-to-Rail; Frequency: NC; Alternate Part Number 1: *; Alternate Part Number 2: *; Tolerance: NC; Revision Date: 03/08/21; Package Reference: SC-70-5
footprint SC-70-5
pins: 1 Vout, 2 -Vs, 3 +IN, 4 -IN, 5 +Vs

## SC-MIC2954-3
designator U?
Linear Voltage Regulator IC Positive Fixed 1 Output 250mA SOT-223-3; Manufacturer Part Number: MIC2954-03WS-TR; Manufacturer: Microchip Technology; Working Temperature: -40°C ~ 125°C; Temperature Coefficient: NC; Short Description: IC REG LINEAR 5V 250MA SOT223-3; Ratings: REACH, ROHS3; Voltage: 30V; Value: NC; Mounting: SMT; Power: NC; Type: Linear; Frequency: NC; Alternate Part Number 1: *; Alternate Part Number 2: *; Tolerance: NC; Current: 250mA; Revision Date: 03/08/21; Package Reference: SOT-223
footprint SOT-223 (Footprint not found)
pins: 1 VIN, 2 GND, 3 VOUT, 4 GND

## SC-MIC5233-5
designator U?
Linear Voltage Regulator IC Positive Fixed 1 Output 100mA SOT-23-5; Manufacturer Part Number: MIC5233-5.0YM5-TR; Manufacturer: Microchip Technology; Working Temperature: -40°C ~ 125°C; Temperature Coefficient: NC; Short Description: IC REG LINEAR 5V 100MA SOT23-5; Ratings: REACH, ROHS3; Voltage: 36V; Value: NC; Mounting: SMT; Power: NC; Type: Linear; Frequency: NC; Alternate Part Number 1: *; Alternate Part Number 2: *; Tolerance: NC; Current: 100mA; Revision Date: 03/08/21; Package Reference: SOT-23-5
footprint SOT-23-5 (Footprint not found)
pins: 1 VIN, 2 GND, 3 ON/OFF, 4 NC, 5 VOUT

## SC-NCA9306-Q
designator U?
2-bit bidirectional I2C multi-voltage level translator; open-drain push-pull.; Manufacturer_Name: Nexperia; Manufacturer_Part_Number: NCA9306DC-Q100; Datasheet Link: https://www.mouser.com/datasheet/2/916/NCA9306_Q100-2933477.pdf; Height: 1mm; Mounting: SMT
footprint SOT765-1
pins: 1 GND, 2 REFA, 3 SCLA, 4 SDAA, 5 SDAB, 6 SCLB, 7 REFB, 8 EN

## SC-P82B96TDT
designator U?
Buffer, ReDriver 2 Channel 400kHz 8-SO; Manufacturer Part Number: P82B96TD-T; Manufacturer: NXP USA Inc.; Working Temperature: -40°C ~ 85°C; Temperature Coefficient: NC; Short Description: IC REDRIVER I2C 2CH 400KHZ 8SO; Ratings: REACH, ROHS3; Voltage: 2V ~ 15V; Value: NC; Mounting: SMT; Power: NC; Type: Buffer; Frequency: 400kHz; Alternate Part Number 1: *; Alternate Part Number 2: *; Tolerance: NC; Current: NC; Revision Date: 03/08/21; Package Reference: SOIC-8N
footprint SOIC-8N (Footprint not found)
pins: 1 Sx, 2 Rx, 3 Tx, 4 GND, 5 Ty, 6 Ry, 7 Sy, 8 VCC
